# Altium footprint library ie-track-kit-arduino-1.PcbLib: 53 footprints (part 2 of 4)
Each footprint in its own frame and in the unit in brackets; x right, y up, seen from the top. Pads: shape width x height; smd on the part's side, far side on the other; paste and mask are expansions set on the pad; w line width, h text height; cw(c..) or ccw(c..) is an arc to the next point about the centre after c.
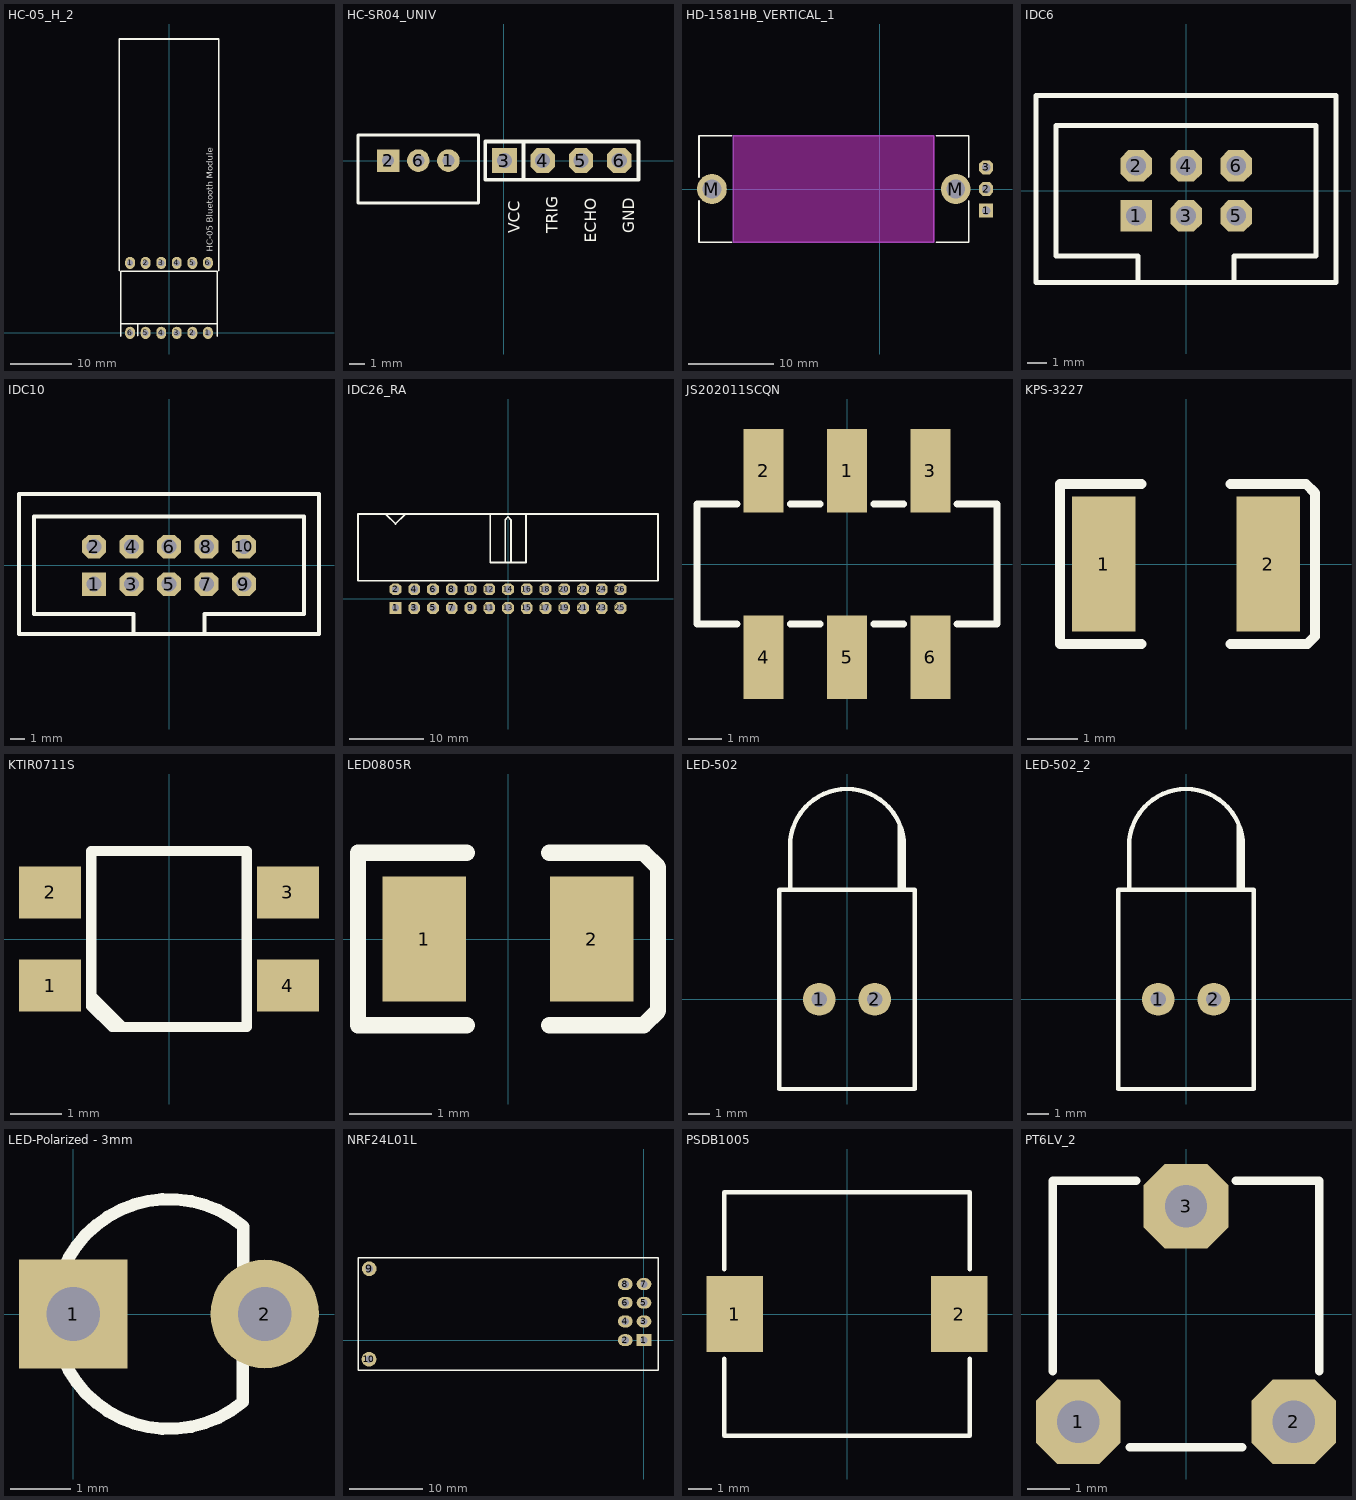
[diagram p1: the footprints below, top view; thin cyan lines are the x and y axes]

## HC-05_H_2 [mm] "HC-05 Bluetooth Module, Mounted Horizontally"
pads (12):
  oval 1.6x2 hole 1: 1(-6.35,11.4) 1(6.35,0) 2(-3.81,11.4) 2(3.81,0) 3(-1.27,11.4) 3(1.27,0) 4(-1.27,0) 4(1.27,11.4) 5(-3.81,0) 5(3.81,11.4) 6(-6.35,0) 6(6.35,11.4)
Top Overlay:
  lines w0.254: -7.874,-0.508 -7.874,10.033 7.874,10.033 7.874,-0.508 ; -7.874,1.454 7.874,1.454 ; -5.08,-0.5 -5.08,1.454
  lines w0.256: -8.128,10.16 -8.128,47.9 8.128,47.9 8.128,10.16
  text "HC-05 Bluetooth Module" at 7.1,13.2 h1
3D body "Samtec-SSW-106-22-G-S-RA.step": height 2.46, standoff -2.5, extent -7.874,-0.254 7.874,9.982
3D body "HC-SERIES.stp": height 6.41, standoff -5.02, extent -7.85,10 7.85,47.6

## HC-SR04_UNIV [mm]
pads (7):
  round 1.5 hole 0.8: 1(-3.667,0) 6(-5.667,0)
  rect 1.5x1.5 hole 0.8: 2(-7.668,0)
  rect 1.651x1.651 hole 1: 3(0.048,0)
  oct 1.651x1.651 hole 1: 4(2.588,0)
  oct 1.6x1.651 hole 1: 5(5.128,0) 6(7.668,0)
Top Overlay:
  lines w0.2: -9.667,-2.8 -1.667,-2.8 -1.667,1.7 -9.667,1.7 -9.667,-2.8
  lines w0.254: 1.318,-1.27 1.318,1.27 ; -1.222,-1.27 -1.222,1.27 8.938,1.27 8.938,-1.27 -1.222,-1.27
  text "GND" at 8.938,-4.826 h1.3
  text "ECHO" at 6.398,-5.461 h1.3
  text "TRIG" at 3.858,-4.826 h1.3
  text "VCC" at 1.318,-4.826 h1.3
3D body "Samtec-TSW-104-23-F-S.STEP": height 8.38, standoff -2.92, extent -1.222,-1.27 8.938,1.27
3D body "B3B-PH-K-S.STEP": height 6, standoff -3.4, extent -9.618,-2.8 -1.717,1.7

## HD-1581HB_VERTICAL_1 [mm]
pads (5):
  rect 1.651x1.651 hole 1: 1(12.446,-2.54)
  oct 1.651x1.651 hole 1: 2(12.446,0) 3(12.446,2.54)
  round 3.5 hole 2.2: M(-19.685,0) M(8.885,0)
Top Overlay:
  lines w0.2: -21.209,-1.397 -21.209,-6.25 -21.082,-6.25 -17.399,-6.223 ; -21.209,1.397 -21.209,6.25 -21.082,6.25 -17.399,6.223 ; 6.599,-6.223 10.282,-6.25 10.409,-6.25 10.409,-1.397 ; 6.599,6.223 10.282,6.25 10.409,6.25 10.409,1.397
Bottom Overlay:
  lines w0.254: 11.176,-1.27 13.716,-1.27 ; 11.176,-3.81 12.946,-3.81 13.716,-3.81 13.716,3.81 11.176,3.81 11.176,-3.81
Keep-Out Layer:
  board cut-out: -17.15,-6.25 -17.15,6.25 6.35,6.25 6.35,-6.25
Mechanical 15:
  lines w0.2: -17.19,-6.25 -17.19,6.25 6.31,6.25 6.31,-6.25 -17.19,-6.25
3D body "Samtec-TSW-103-23-F-S.STEP": height 8.38, standoff -2.92, extent 11.176,-3.81 13.716,3.81
3D body "User Library-Micro Digital Servo HD-1581HB-1.STEP": height 14.95, standoff -14.75, extent -21,-6 10.2,6

## IDC6 [mm] "2.54mm, 6 Pin IDC Male Connector"
height 1.6
pads (6):
  rect 1.6x1.6 hole 1: 1(-2.54,-1.27)
  oct 1.6x1.6 hole 1: 2(-2.54,1.27) 3(0,-1.27) 4(0,1.27) 5(2.54,-1.27) 6(2.54,1.27)
Top Overlay:
  lines w0.254: -2.438,-4.645 -2.438,-3.32 ; -2.438,-3.302 -6.604,-3.302 -6.604,3.302 6.604,3.302 6.604,-3.302 2.438,-3.302 ; 2.438,-4.645 2.438,-3.32 ; -7.62,-4.64 -7.62,4.826 7.61,4.826 7.61,-4.645 -7.615,-4.645 -7.62,-4.64
3D body "HTST-103-01-LM-D.STEP": height 9.29, standoff -2.9, extent -7.62,-4.57 7.62,4.701

## IDC10 [mm] "2.54mm, 10 Pin IDC Male Connector"
height 9.45
pads (10):
  rect 1.6x1.6 hole 1: 1(-5.08,-1.27)
  oct 1.6x1.6 hole 1: 2(-5.08,1.27) 3(-2.54,-1.27) 4(-2.54,1.27) 5(0,-1.27) 6(0,1.27) 7(2.54,-1.27) 8(2.54,1.27) 9(5.08,-1.27) 10(5.08,1.27)
Top Overlay:
  lines w0.254: -2.413,-4.5 -2.413,-3.302 -9.144,-3.302 -9.144,3.302 9.144,3.302 9.144,-3.302 2.413,-3.302 2.413,-4.5 ; -10.16,-4.645 -10.16,4.826 10.16,4.826 10.16,-4.645 -10.16,-4.645
3D body "Samtec-HTST-105-01-G-D.STEP": height 9.27, standoff -2.92, extent -10.16,-4.648 10.16,4.826

## IDC26_RA [mm] "2.54mm, 26 Pin IDC Male Connector, Right Angle"
height 9.45
pads (26):
  rect 1.6x1.6 hole 1: 1(-15.24,-1.27)
  oct 1.6x1.6 hole 1: 2(-15.24,1.27) 3(-12.7,-1.27) 4(-12.7,1.27) 5(-10.16,-1.27) 6(-10.16,1.27) 7(-7.62,-1.27) 8(-7.62,1.27) 9(-5.08,-1.27) 10(-5.08,1.27) 11(-2.54,-1.27) 12(-2.54,1.27) 13(0,-1.27) 14(0,1.27) 15(2.54,-1.27) 16(2.54,1.27) 17(5.08,-1.27) 18(5.08,1.27) 19(7.62,-1.27) 20(7.62,1.27) 21(10.16,-1.27) 22(10.16,1.27) 23(12.7,-1.27) 24(12.7,1.27) 25(15.24,-1.27) 26(15.24,1.27)
Top Overlay:
  lines w0.254: -16.548,11.417 -15.24,10.109 -13.919,11.43 ; -2.413,11.43 -2.413,4.877 2.413,4.877 ; -0.381,4.877 -0.381,10.668 0,11.049 0.381,10.668 0.381,4.877 ; 2.413,4.928 2.413,11.43 ; -20.32,2.413 -20.32,11.43 20.32,11.43 20.32,2.413 -20.32,2.413
3D body "Samtec-HTST-113-01-G-D-RA.step": height 9.46, standoff -3.24, extent -20.32,-1.524 20.32,11.43

## JS202011SCQN [mm] "C&K DPDT Switch"
height 1.6
pads (6):
  rect 1.2x2.5 smd: 1(0,2.8) 2(-2.5,2.8) 3(2.5,2.8) 4(-2.5,-2.8) 5(0,-2.8) 6(2.5,-2.8)
Top Overlay:
  lines w0.2: -3.3,-1.8 -4.5,-1.8 -4.5,1.8 -3.3,1.8 ; -1.7,-1.8 -0.8,-1.8 ; -1.7,1.8 -0.8,1.8 ; 0.8,-1.8 1.7,-1.8 ; 0.8,1.8 1.7,1.8 ; 3.3,-1.8 4.5,-1.8 4.5,1.8 3.3,1.8
3D body: height 3.55, standoff 3.4, extent -2.25,-1 2.25,1
3D body: height 3.5, standoff 0, extent -4.5,-1.8 4.5,1.8
3D body: height 5.5, standoff 3.4, extent 0.5,-0.8 2,0.8
3D body: height 0.3, standoff 0, extent -2.75,1.8 -2.25,3.5
3D body: height 0.3, standoff 0, extent -0.25,1.8 0.25,3.5
3D body: height 0.3, standoff 0, extent 2.25,1.8 2.75,3.5
3D body: height 0.3, standoff 0, extent -2.75,-3.5 -2.25,-1.8
3D body: height 0.3, standoff 0, extent 2.25,-3.5 2.75,-1.8
3D body: height 0.3, standoff 0, extent -0.25,-3.5 0.25,-1.8

## KPS-3227 [mm]
height 2.2
pads (2):
  rect 1.27x2.7 smd: 1(-1.65,0) 2(1.65,0)
Top Overlay:
  lines w0.2: -0.889,-1.6 -2.525,-1.6 -2.525,1.6 -0.889,1.6 ; 0.889,-1.6 2.425,-1.6 2.575,-1.45 2.575,1.425 2.4,1.6 0.889,1.6
3D body "User Library-KPS-3227SP1C.step": height 1.12, standoff 0, extent -1.6,-1.35 1.6,1.35

## KTIR0711S [mm]
height 1.6
pads (4):
  rect 1.2x1 smd: 1(-2.3,-0.9) 2(-2.3,0.9) 3(2.3,0.9) 4(2.3,-0.9)
Top Overlay:
  lines w0.2: -1.5,-1.1 -0.9,-1.7 ; -1.5,-1.3 -1.5,1.7 1.5,1.7 1.5,-1.7 -1.1,-1.7 -1.5,-1.3
3D body: height 1.5, standoff 0, extent -1.3,0.2 1.3,1.5
3D body: height 1.5, standoff 0, extent -1.3,-1.5 1.3,-0.2
3D body: height 1.4, standoff 0.1, extent -1.5,-1.7 1.5,1.7
3D body: height 0.65, standoff 0, extent -2.6,0.5 -1.5,1.3
3D body: height 0.65, standoff 0, extent 1.5,-1.3 2.6,-0.5
3D body: height 0.65, standoff 0, extent 1.5,0.5 2.6,1.3
3D body: height 0.65, standoff 0, extent -2.6,-1.3 -1.5,-0.5

## LED0805R [mil]
height 49.21
pads (2):
  rect 40x60 smd: 1(-40,0) 2(40,0)
Top Overlay:
  lines w7.87: -19.68,-41.34 -71.85,-41.34 -71.85,41.34 -19.68,41.34 ; 19.68,-41.34 64.96,-41.34 71.85,-34.45 71.85,34.45 64.96,41.34 19.68,41.34
3D body "User Library-led_0805.step": height 43.31, standoff 0, extent -39.76,-24.61 39.76,24.6

## LED-502 [mm] "FIX&FASTEN"
height 1.6
pads (2):
  round 1.5 hole 0.7: 1(-1.27,0) 2(1.27,0)
Top Overlay:
  lines w0.2: -2.6,5.1 -2.6,7.1 ; -2.6,7 cw(c0,7) 2.6,7 2.6,5 ; 2.4,5 2.4,8 ; 2.5,5 2.5,7.7 ; -3.1,-4.1 3.1,-4.1 3.1,5 -3.1,5 -3.1,-4.1
3D body "User Library-LED RA RED VCC 5300H1.stp": height 6.17, standoff -2.49, extent -3.048,-4.078 3.048,10.4

## LED-502_2 [mm]
pads (2):
  round 1.5 hole 0.7: 1(-1.27,0) 2(1.27,0)
Top Overlay:
  lines w0.2: -2.6,5.1 -2.6,7.1 ; -2.6,7 cw(c0,7) 2.6,7 2.6,5 ; 2.4,5 2.4,8 ; 2.5,5 2.5,7.7 ; -3.1,-4.1 3.1,-4.1 3.1,5 -3.1,5 -3.1,-4.1
3D body "User Library-LED RA RED VCC 5300H1.stp": height 6.17, standoff -2.49, extent -3.048,-4.078 3.048,10.4

## LED-Polarized - 3mm [mm]
height 9.45
pads (2):
  rect 1.8x1.8 hole 0.889: 1(0,0)
  round 1.8 hole 0.889: 2(3.175,0)
Top Overlay:
  lines w0.203: 2.812,-0.767 2.812,-1.459 cw(c1.587,0) 2.812,1.459 ; 2.819,0.737 2.819,1.447

## NRF24L01L [mm]
height 1.6
pads (10):
  rect 2x1.6 hole 1: 1(0,0)
  oval 2x1.6 hole 1: 2(-2.54,0) 3(0,2.54) 4(-2.54,2.54) 5(0,5.08) 6(-2.54,5.08) 7(0,7.62) 8(-2.54,7.62)
  round 2 hole 1: 9(-37.375,9.7) 10(-37.4,-2.6)
Top Overlay:
  lines w0.2: -38.895,-4.1 -38.895,11.2 1.905,11.2 1.905,-4.1 -38.895,-4.1
3D body "User Library-142-0701-301.step": height 14.24, standoff 0.74, extent -46.775,-0.962 -31.14,6.962
3D body: height 4, standoff 3, extent -38.9,-4.1 1.9,11.2

## PSDB1005 [mm] "PSDB Series Shielded SMD Power Inductor"
height 1.6
pads (2):
  rect 2.4x3.2 smd: 1(-4.75,0) 2(4.75,0)
Top Overlay:
  lines w0.2: -5.2,-1.9 -5.2,-5.15 5.2,-5.15 5.2,-1.9 ; -5.2,1.9 -5.2,5.15 5.2,5.15 5.2,1.9
3D body "User Library-IND_MURATA_MBH10145C.STEP": height 4.85, standoff 0.05, extent -5.2,-5.2 5.2,5.2

## PT6LV_2 [mm] "Piher trimming potentiometer: PT6-series"
height 4
pads (3):
  oct 2x2 hole 1: 1(-2.54,-2.54) 2(2.54,-2.54) 3(0,2.54)
Top Overlay:
  lines w0.2: -3.15,-1.35 -3.15,3.15 -1.175,3.15 ; -1.325,-3.15 1.325,-3.15 ; 1.175,3.15 3.15,3.15 3.15,-1.35
3D body "User Library-RES_PT6-3.step": height 4.05, standoff -3.24, extent -3.15,-3.15 3.15,3.15